# Altium footprint library PcbLib.PcbLib: 142 footprints (part 1 of 9)
Each footprint in its own frame and in the unit in brackets; x right, y up, seen from the top. Pads: shape width x height; smd on the part's side, far side on the other; paste and mask are expansions set on the pad; w line width, h text height; cw(c..) or ccw(c..) is an arc to the next point about the centre after c.
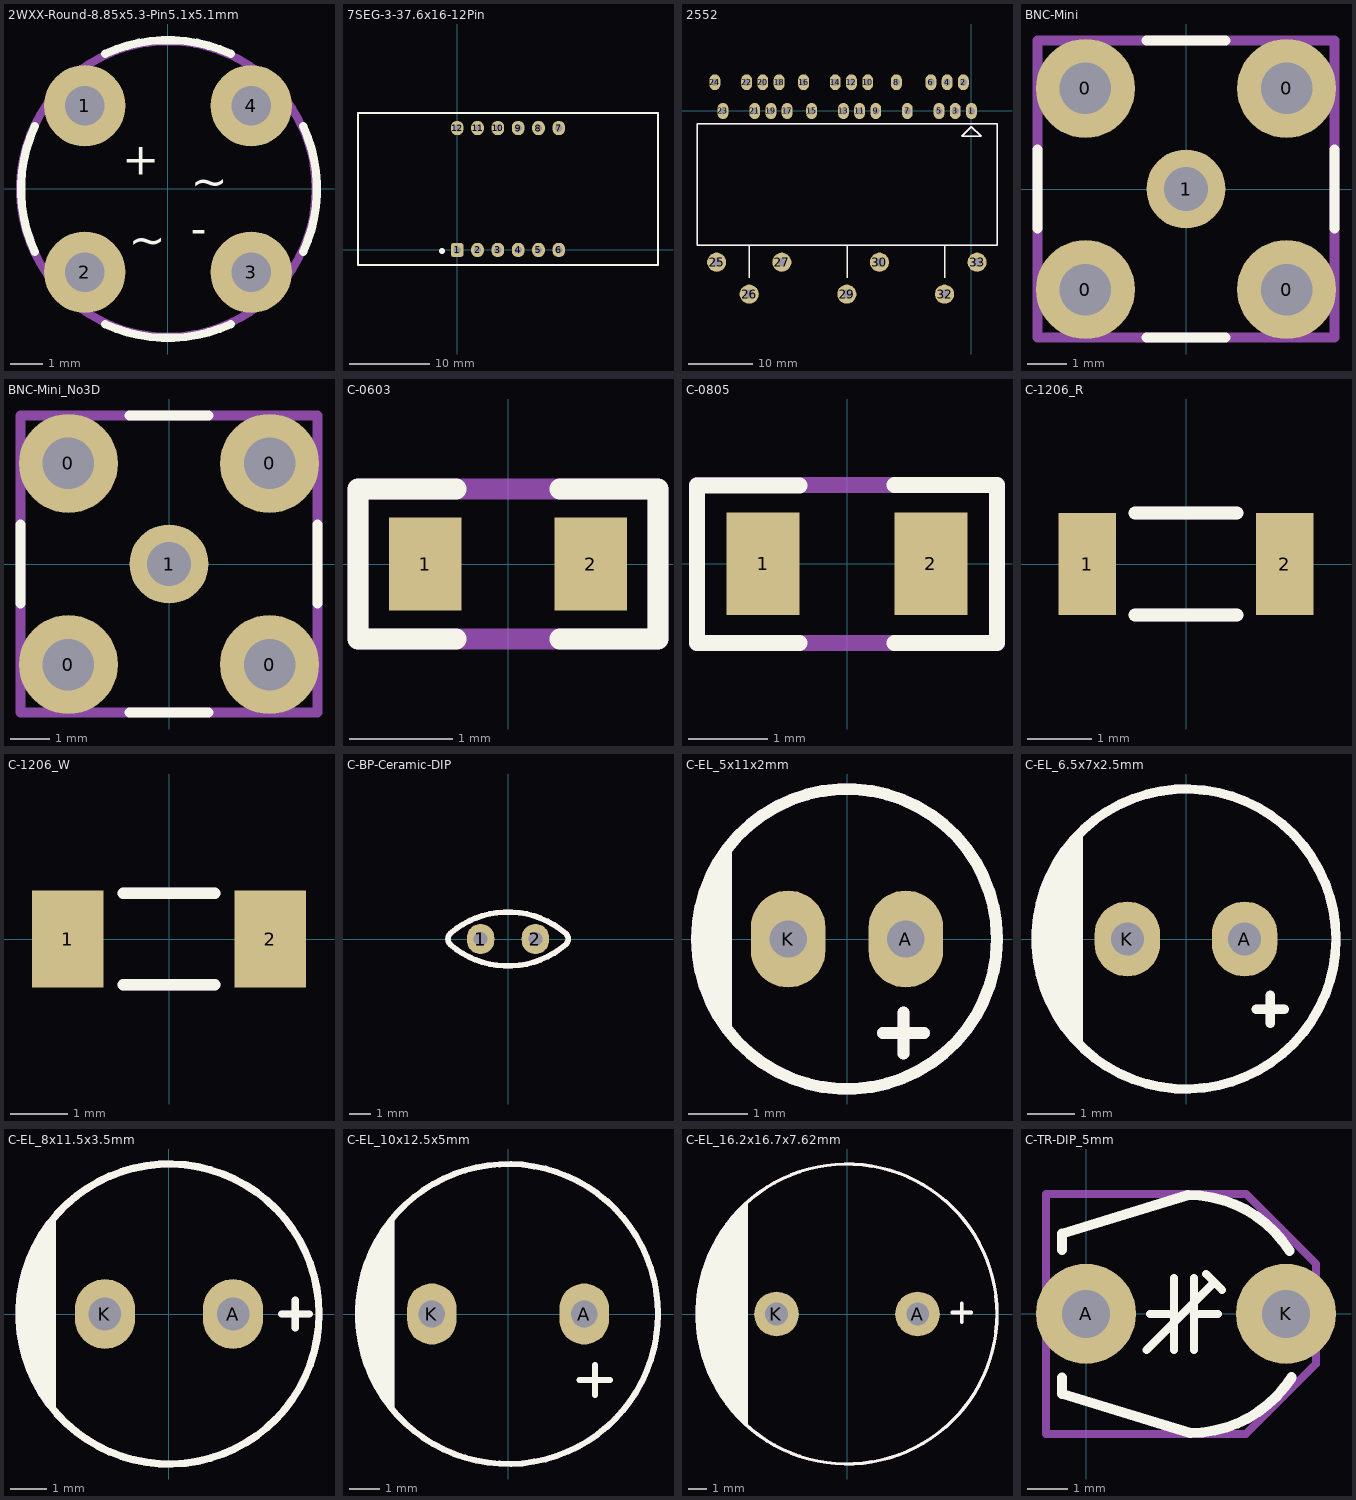
[diagram p0: the footprints below, top view; thin cyan lines are the x and y axes]

## 2WXX-Round-8.85x5.3-Pin5.1x5.1mm [mm]
pads (4):
  round 2.5 hole 1.2: 1(-2.55,2.55) 2(-2.55,-2.55) 3(2.55,-2.55) 4(2.55,2.55)
Top Overlay:
  lines w0.254: -4.08,-1.92 cw(c0.062,-0.001) -4.08,1.919 ; -1.919,-4.142 ccw(c0,0) 1.919,-4.142 ; -1.919,4.142 cw(c0,0) 1.919,4.142 ; 4.142,-1.919 ccw(c0,0) 4.142,1.919
  text "+" at -1.4,0.433 h1
  text "-" at 0.7,-1.7 h1
  text "~" at 0.7,-0.233 h1
  text "~" at -1.2,-2.033 h1
Mechanical 29:
  circle w0.254: c0,0 r4.53
  text "-" at 2.3,-3 h1
  text "+" at -2.9,1.933 h1
  text "~" at 2.3,1.467 h1
  text "~" at -2.8,-3.433 h1
  text ".Designator" at -1.4,-0.567 h1
3D body "Part2.STEP": height 5.4, standoff -1.9, extent -6.258,-6.258 6.258,6.258

## 7SEG-3-37.6x16-12Pin [mm]
pads (12):
  rrect50% 1.6x1.8 hole 0.9: 1(0,0)
  oval 1.6x1.8 hole 0.9: 2(2.54,0) 3(5.08,0) 4(7.62,0) 5(10.16,0) 6(12.7,0) 7(12.7,15.24) 8(10.16,15.24) 9(7.62,15.24) 10(5.08,15.24) 11(2.54,15.24) 12(0,15.24)
Top Overlay:
  circle w0.3: c-1.9,-0.13 r0.2
  lines w0.254: -12.4,-1.88 25.1,-1.88 25.1,17.12 -12.4,17.12 -12.4,-1.88
Mechanical 29:
  circle w0.3: c-1.9,-0.13 r0.2
  lines w0.254: -12.4,-1.88 25.1,-1.88 25.1,17.12 -12.4,17.12 -12.4,-1.88
  text ".Designator" at 2.74,8.153 h1
3D body "User Library-5631_w_o_color_jam.step": height 8.11, standoff -5.49, extent -12.45,-1.88 25.15,17.12

## 2552 [mm]
pads (31):
  oval 1.7x2.5 hole 1.1: 1(0,0) 2(-1.27,4.5) 3(-2.54,0) 4(-3.81,4.5) 5(-5.08,0) 6(-6.35,4.5) 7(-10.05,0) 8(-11.75,4.5) 9(-14.99,0) 10(-16.26,4.5) 11(-17.53,0) 12(-18.8,4.5) 13(-20.07,0) 14(-21.34,4.5) 15(-25.04,0) 16(-26.31,4.5) 17(-28.88,0) 18(-30.15,4.5) 19(-31.42,0) 20(-32.69,4.5) 21(-33.96,0) 22(-35.23,4.5) 23(-38.93,0) 24(-40.2,4.5)
  round 3 hole 1.4: 25(-39.92,-23.7) 26(-34.82,-28.7) 27(-29.72,-23.7) 29(-19.52,-28.7) 30(-14.42,-23.7) 32(-4.22,-28.7) 33(0.88,-23.7)
Top Overlay:
  lines w0.2: -34.798,-26.162 -34.798,-21.082 ; -19.498,-26.162 -19.498,-21.082 ; -4.198,-26.162 -4.198,-21.082 ; -43,-21 4,-21 4,-2 -43,-2 -43,-21 ; -1.5,-4 1.5,-4 0,-2.5 -1.5,-4
Mechanical 29:
  lines w0.2: -43,-21 4,-21 4,-2 -43,-2 -43,-21 ; -1.5,-4 1.5,-4 0,-2.5 -1.5,-4
  text ".Designator" at -27.3,-13.634 h5
3D body "SCM1242MF-2.STEP": height 4.8, standoff 0.3, extent -43.058,-20.95 3.942,-1.95

## BNC-Mini [mm]
pads (5):
  round 2.5 hole 1.3 mask+0.102: 0(-2.54,-2.54) 0(-2.54,2.54) 0(2.54,-2.54) 0(2.54,2.54)
  round 2 hole 1.12 mask+0.102: 1(0,0)
Top Overlay:
  lines w0.254: -3.75,-1 -3.75,1 ; -1,-3.75 1,-3.75 ; -1,3.75 1,3.75 ; 3.75,-1 3.75,1
Mechanical 29:
  lines w0.254: -3.75,-3.75 3.75,-3.75 3.75,3.75 -3.75,3.75 -3.75,-3.75
  text ".Designator" at -1.3,-0.467 h1
3D body "c-1274571-1-b-3d.stp": height 11.5, standoff -3.99, extent -3.772,-4.508 3.772,4.509

## BNC-Mini_No3D [mm]
pads (5):
  round 2.5 hole 1.3 mask+0.102: 0(-2.54,-2.54) 0(-2.54,2.54) 0(2.54,-2.54) 0(2.54,2.54)
  round 2 hole 1.12 mask+0.102: 1(0,0)
Top Overlay:
  lines w0.254: -3.75,-1 -3.75,1 ; -1,-3.75 1,-3.75 ; -1,3.75 1,3.75 ; 3.75,-1 3.75,1
Mechanical 29:
  lines w0.254: -3.75,-3.75 3.75,-3.75 3.75,3.75 -3.75,3.75 -3.75,-3.75
  text ".Designator" at -1.3,-0.467 h1

## C-0603 [mm]
pads (2):
  rect 0.7x0.9 smd: 1(-0.8,0) 2(0.8,0)
Top Overlay:
  lines w0.2: -0.5,-0.725 -1.45,-0.725 -1.45,0.725 -0.5,0.725 ; 0.5,-0.725 1.45,-0.725 1.45,0.725 0.5,0.725
Mechanical 29:
  lines w0.2: -1.45,-0.725 -1.45,0.725 1.45,0.725 1.45,-0.725 -1.45,-0.725
  text ".Designator" at -1.05,-0.467 h1
3D body "User Library-CAPC1608X09.step": height 0.9, standoff 0, extent -0.8,-0.4 0.8,0.4

## C-0805 [mm] "Multilayer Chip Capacitors - General"
pads (2):
  rect 0.925x1.3 smd: 1(-1.062,0) 2(1.062,0)
Top Overlay:
  lines w0.2: -0.6,-1.002 -1.9,-1.002 -1.9,0.993 -0.6,0.993 ; 0.6,-1.002 1.9,-1.002 1.9,1 0.6,1
Mechanical 29:
  lines w0.2: -1.9,-1 -1.9,1 1.9,1 1.9,-1 -1.9,-1
  text ".Designator" at -1,-0.467 h1
3D body "Ceramic_Capacitor_0805_h32mil.step": height 0.81, standoff 0.01, extent -1,-0.625 1,0.625

## C-1206_R [mm] "REFLOW SOLDERING"
pads (2):
  rect 0.9x1.6 smd: 1(-1.55,0) 2(1.55,0)
Top Overlay:
  lines w0.2: -0.8,-0.8 0.8,-0.8 ; -0.8,0.8 0.8,0.8
Mechanical 29:
  lines w0.2: -0.8,-0.8 0.8,-0.8 ; -0.8,0.8 0.8,0.8
  text ".Designator" at -0.7,-0.467 h1
3D body "Ceramic_Capacitor_1206_h38mil.step": height 0.96, standoff 0.01, extent -1.6,-0.8 1.6,0.8

## C-1206_W [mm] "WAVE SOLDERING"
pads (2):
  rect 1.25x1.7 smd: 1(-1.775,0) 2(1.775,0)
Top Overlay:
  lines w0.2: -0.8,-0.8 0.8,-0.8 ; -0.8,0.8 0.8,0.8
Mechanical 29:
  lines w0.2: -0.8,-0.8 0.8,-0.8 ; -0.8,0.8 0.8,0.8
  text ".Designator" at -0.7,-0.467 h1
3D body "Ceramic_Capacitor_1206_h38mil.step": height 0.96, standoff 0.01, extent -1.6,-0.8 1.6,0.8

## C-BP-Ceramic-DIP [mil]
pads (2):
  oval 50x55 hole 25: 1(-50,0) 2(50,0)
Top Overlay:
  lines w10: -105.81,-9.79 ccw(c0,112.17) 106.05,-9.58 ; -105.81,9.79 cw(c0,-112.17) 106.05,9.58 ; -105.58,-9.52 cw(c-96.06,0) -105.58,9.52 ; 106,-9.52 ccw(c96.48,0) 106,9.52
Mechanical 29:
  lines w10: -105.81,-9.79 ccw(c0,112.17) 106.05,-9.58 ; -105.81,9.79 cw(c0,-112.17) 106.05,9.58 ; -105.58,-9.52 cw(c-96.06,0) -105.58,9.52 ; 106,-9.52 ccw(c96.48,0) 106,9.52
  text ".Designator" at -35.43,-14.44 h39.37
3D body "Cap 100n.STEP": height 272.48, standoff -39.37, extent -114.93,-34 114.93,32.79

## C-EL_5x11x2mm [mm]
pads (2):
  oval 1.27x1.651 hole 0.635: A(1,0) K(-1,0)
Top Overlay:
  circle w0.2: c0,0 r2.55
  region: -1.956,-1.651 -1.956,1.626 -2.21,1.295 -2.388,0.914 -2.54,0.279 -2.515,-0.457 -2.337,-1.118
  lines w0.2: 0.61,-1.6 1.31,-1.6 ; 0.96,-1.95 0.96,-1.25
Mechanical 29:
  circle w0.2: c0,0 r2.55
  region: -1.956,-1.651 -1.956,1.626 -2.21,1.295 -2.388,0.914 -2.54,0.279 -2.515,-0.457 -2.337,-1.118
  lines w0.2: 0.61,-1.6 1.31,-1.6 ; 0.96,-1.95 0.96,-1.25
  text ".Designator" at -0.8,-0.467 h1
3D body "User Library-ECAP5_11_20.step": height 11.1, standoff -2.2, extent -2.5,-2.498 2.5,2.498

## C-EL_6.5x7x2.5mm [mm]
pads (2):
  oval 1.4x1.6 hole 0.7: A(1.25,0) K(-1.25,0)
Top Overlay:
  circle w0.2: c0,0 r3.2
  region: -2.2,-2.3 -2.355,-2.152 -2.622,-1.816 -2.842,-1.448 -3.011,-1.053 -3.125,-0.64 -3.183,-0.215 -3.183,0.215 -3.125,0.64 -3.011,1.053 -2.842,1.448 -2.622,1.816 -2.355,2.152 -2.2,2.3
  lines w0.2: 1.5,-1.5 2.1,-1.5 ; 1.8,-1.8 1.8,-1.2
Mechanical 29:
  circle w0.2: c0,0 r3.2
  region: -2.2,-2.3 -2.355,-2.152 -2.622,-1.816 -2.842,-1.448 -3.011,-1.053 -3.125,-0.64 -3.183,-0.215 -3.183,0.215 -3.125,0.64 -3.011,1.053 -2.842,1.448 -2.622,1.816 -2.355,2.152 -2.2,2.3
  lines w0.2: 1.5,-1.5 2.1,-1.5 ; 1.8,-1.8 1.8,-1.2
  text ".Designator" at -0.8,-0.467 h1
3D body "CAP_10uF_50V_low_profile.stp": height 7.2, standoff -3.4, extent -3.161,-3.16 3.161,3.16

## C-EL_8x11.5x3.5mm [mil]
pads (2):
  oval 65x75 hole 35: A(68.9,0) K(-68.9,0)
Top Overlay:
  circle w7.87: c0,0 r161.42
  region: -122.05,-102.36 -128.32,-95.41 -139.07,-80.09 -147.88,-63.57 -154.6,-46.1 -159.13,-27.94 -161.42,-9.36 -161.42,9.36 -159.13,27.94 -154.6,46.1 -147.88,63.57 -139.07,80.09 -128.32,95.41 -122.05,102.36
  lines w7.87: 121,0 151,0 ; 136,-15 136,15
Mechanical 29:
  circle w7.87: c0,0 r161.42
  region: -122.05,-102.36 -128.32,-95.41 -139.07,-80.09 -147.88,-63.57 -154.6,-46.1 -159.13,-27.94 -161.42,-9.36 -161.42,9.36 -159.13,27.94 -154.6,46.1 -147.88,63.57 -139.07,80.09 -128.32,95.41 -122.05,102.36
  lines w7.87: 121,0 151,0 ; 136,-15 136,15
  text ".Designator" at -31.5,-18.38 h39.37
3D body "SW3dPS-Cap electro 8x11.5x3.5mm_V2008.STEP": height 473.44, standoff -136.91, extent -159.48,-159 157.48,157.96

## C-EL_10x12.5x5mm [mil]
pads (2):
  oval 65x80 hole 35: A(100,0) K(-100,0)
Top Overlay:
  circle w7.87: c0,0 r196.85
  region: -149.61,-129.92 -157.16,-121.09 -170.08,-101.77 -180.64,-81.07 -188.69,-59.27 -194.13,-36.67 -196.86,-13.59 -196.86,9.65 -194.13,32.73 -188.69,55.33 -180.64,77.13 -170.08,97.84 -157.16,117.15 -149.61,125.98
  lines w7.87: 93.86,-86.61 133.86,-86.61 ; 113.86,-106.61 113.86,-66.61
Mechanical 29:
  circle w7.87: c0,0 r196.85
  region: -149.61,-129.92 -157.16,-121.09 -170.08,-101.77 -180.64,-81.07 -188.69,-59.27 -194.13,-36.67 -196.86,-13.59 -196.86,9.65 -194.13,32.73 -188.69,55.33 -180.64,77.13 -170.08,97.84 -157.16,117.15 -149.61,125.98
  lines w7.87: 93.86,-86.61 133.86,-86.61 ; 113.86,-106.61 113.86,-66.61
  text ".Designator" at -31.5,-18.38 h39.37
3D body "SW3dPS-Cap electro 10x12.5x5.0mm.STEP": height 512.81, standoff -136.91, extent -197.7,-197 198,198.7

## C-EL_16.2x16.7x7.62mm [mil]
pads (2):
  round 95 hole 48: A(150,0) K(-150,0)
Top Overlay:
  circle w7: c0,0 r318.9
  region: -211,-238 -211,235 -241,210 -273,164 -302,100 -315,50 -319,-2 -309,-79 -286,-141 -249,-200
  lines w7.87: 224,3 264,3 ; 244,-17 244,23
Mechanical 29:
  circle w7: c0,0 r318.9
  region: -211,-238 -211,235 -241,210 -273,164 -302,100 -315,50 -319,-2 -309,-79 -286,-141 -249,-200
  lines w7.87: 224,3 264,3 ; 244,-17 244,23
  text ".Designator" at -51.18,-18.38 h39.37
3D body "SW3dPS-Cap electro 16.2x16x7.62mm_V2008.STEP": height 650.61, standoff -147.28, extent -320,-320 319.8,319.8

## C-TR-DIP_5mm [mm]
pads (2):
  round 2.5 hole 1.2 mask+0.102: A(0,0) K(5,0)
Top Overlay:
  lines w0.2: 1.513,-0.905 3.2,0.782 ; 1.6,0 2.2,0 ; 2.2,-0.9 2.2,0.9 ; 2.7,-0.9 2.7,0.9 ; 2.7,0 3.3,0 ; 3,1 3.4,0.6
  lines w0.254: -0.6,-1.6 -0.6,-2 2.604,-2.982 ccw(c2.604,0.02) 5.14,-1.586 ; -0.6,1.6 -0.6,2 2.552,2.971 cw(c2.552,-0.031) 5.088,1.575
Mechanical 29:
  lines w0.2: -1,-3 4,-3 5.75,-1.25 5.75,1.25 4,3 -1,3 -1,-3
  text ".Designator" at 1.2,-0.467 h1
3D body "Trimmer Cap - Green.stp": height 5.08, standoff -2.53, extent -1.056,-3.046 5.707,3.046